# Altium footprint library passive.PcbLib: 73 footprints (part 5 of 5)
Each footprint in its own frame and in the unit in brackets; x right, y up, seen from the top. Pads: shape width x height; smd on the part's side, far side on the other; paste and mask are expansions set on the pad; w line width, h text height; cw(c..) or ccw(c..) is an arc to the next point about the centre after c.
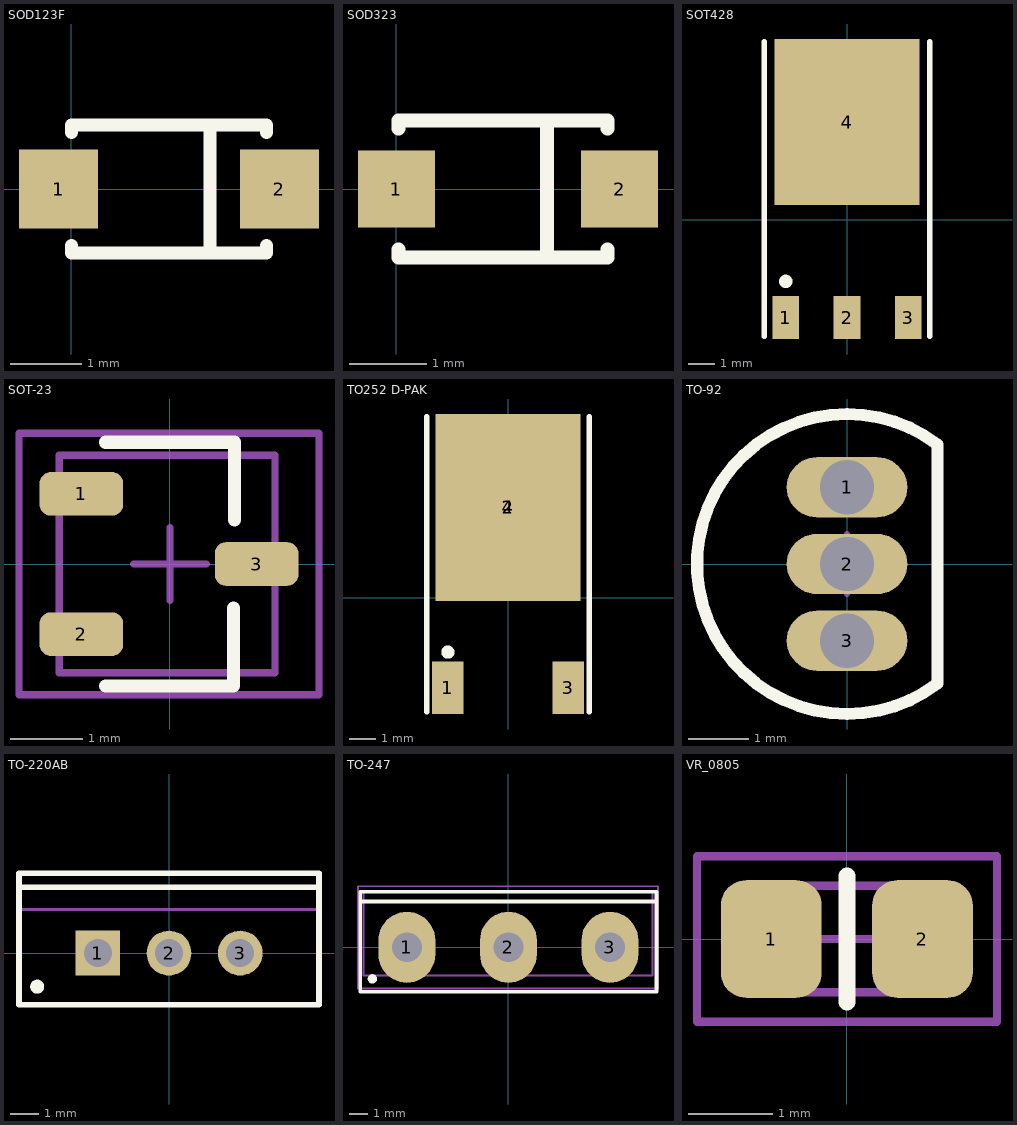
[diagram p4: the footprints below, top view; thin cyan lines are the x and y axes]

## SOD123F [mm]
pads (2):
  rect 1.1x1.1 smd: 1(-0.178,0) 2(2.896,0)
Top Overlay:
  lines w0.18: 0,-0.787 0,-0.889 2.718,-0.889 2.718,-0.787 ; 0,0.787 0,0.889 2.718,0.889 2.718,0.787 ; 1.93,-0.864 1.93,0.889
3D body "User Library-SOD3716X14.step": height 1.35, standoff 0, extent -0.491,-0.762 3.209,0.787

## SOD323 [mm]
height 1.1
pads (2):
  rect 1x1 smd: 1(0,0) 2(2.9,0)
Top Overlay:
  lines w0.18: 0.025,-0.787 0.025,-0.889 2.743,-0.889 2.743,-0.787 ; 0.025,0.787 0.025,0.889 2.743,0.889 2.743,0.787 ; 1.956,-0.864 1.956,0.889
3D body "User Library-SOD323-1.step": height 1.1, standoff 0, extent 0.148,-0.675 2.748,0.675

## SOT428 [mm] "D-PAK/TO-252-AA; 3 Leads (1 Cropped); Body 10.4 (inc. leads) x 6.7 mm (LxW max)"
height 2.38
pads (4):
  rect 1x1.6 smd: 1(-2.285,-3.65) 2(0,-3.65) 3(2.285,-3.65)
  rect 5.4x6.2 smd: 4(0,3.65)
Top Overlay:
  circle w0.25: c-2.285,-2.3 r0.125
  lines w0.2: -3.085,-4.35 -3.085,6.65 ; 3.085,-4.35 3.085,6.65

## SOT-23 [mm] "SOT23, 3-Leads, Body 2.9x1.3mm, Pitch 0.95mm, Lead Span 2.5mm, IPC Medium Density"
height 1.1
pads (3):
  rrect50% 1.15x0.6 smd: 1(-1.219,0.965) 2(-1.219,-0.965) 3(1.194,0)
Top Overlay:
  lines w0.18: -0.889,-1.678 0.878,-1.678 0.878,-0.61 ; -0.889,1.676 0.889,1.676 0.889,0.61
Mechanical 13:
  lines w0.1: -1.524,-1.499 1.448,-1.499 1.448,1.499 -1.524,1.499 -1.524,-1.499
  text ".Designator" at -1.681,1.782 h0.5
  text ".Value" at -1.016,-0.152 h0.5
Mechanical 15:
  lines w0.1: -0.5,0 0.5,0 ; 0,-0.5 0,0.5 ; -2.078,-1.799 2.053,-1.799 2.053,1.799 -2.078,1.799 -2.078,-1.799
3D body "User Library-SOT95P280X135-3M[SOT23_TO-236AA].step": height 1.3, standoff 0, extent -1.525,-1.5 1.475,1.5

## TO252 D-PAK [mm] "D-PAK/TO-252-AA; 3 Leads (1 Cropped); Body 10.4 (inc. leads) x 6.7 mm (LxW max)"
height 2.38
pads (4):
  rect 1.2x2 smd: 1(-2.285,-3.425) 3(2.285,-3.425)
  rect 5.5x7.1 smd: 2(0,3.425) 4(0,3.425)
Top Overlay:
  circle w0.25: c-2.285,-2.075 r0.125
  lines w0.2: -3.085,-4.35 -3.085,6.875 ; 3.085,-4.35 3.085,6.875

## TO-92 [mm] "TO, Flat Index; 3 In-Line, Axial Leads; Body Dia. 4.5mm; Leads 0.51 x 0.48 mm (max)"
height 6.86
pads (3):
  oval 2x1 hole 0.9: 1(0,1.27) 2(0,0) 3(0,-1.27)
Top Overlay:
  lines w0.2: 1.5,-1.98 cw(c0,0) 1.5,1.98 1.5,-1.98
Mechanical 13:
  lines w0.1: 1.5,-1.98 cw(c0,0) 1.5,1.98 1.5,-1.98
Mechanical 15:
  lines w0.1: -0.5,0 0.5,0 ; 0,-0.5 0,0.5
3D body "User Library-MPSA92 Transistors PNP TO-92 3L (2,54mm).step": height 4.82, standoff -14.7, extent -2.38,-2.38 1.25,2.38

## TO-220AB [mm] "TO, Thru-Hole, Vertical, Heatsink Mounted; 3 In-Line Leads; Pitch 2.54 mm"
height 19.3
pads (3):
  rect 1.6x1.6 hole 1: 1(-2.54,0)
  round 1.6 hole 1: 2(0,0) 3(2.54,0)
Top Overlay:
  circle w0.25: c-4.7,-1.2 r0.125
  lines w0.2: -5.35,2.35 5.35,2.35 ; -5.35,-1.85 5.35,-1.85 5.35,2.85 -5.35,2.85 -5.35,-1.85
Mechanical 13:
  lines w0.1: -5.35,1.55 5.35,1.55 ; -5.35,-1.85 -5.35,2.85 5.35,2.85 5.35,-1.85 -5.35,-1.85
Mechanical 15:
  lines w0.1: -0.5,0 0.5,0 ; 0,-0.5 0,0.5
3D body: height 19.3, standoff 12.9, extent -5.349,1.551 5.349,2.849
3D body: height 12.9, standoff 4, extent -5.4,-1.9 5.4,2.9

## TO-247 [mm] "SIP with Mounting Hole; 3 Leads; Body 20 x 15.6 x 5 mm (typ); Pitch 5.45 mm"
height 24.6
pads (3):
  oval 3.048x3.81 hole 1.6: 1(-5.45,0) 2(0,0) 3(5.45,0)
Top Overlay:
  circle w0.25: c-7.3,-1.696 r0.125
  lines w0.2: -7.95,2.454 7.95,2.454 ; -7.95,-2.388 7.95,-2.388 7.95,2.976 -7.95,2.976 -7.95,-2.388
Mechanical 13:
  lines w0.1: -7.772,-1.524 7.725,-1.524 7.725,2.976 -7.772,2.976 -7.772,-1.524
  text ".Designator" at -7.818,3.267 h0.5
  text ".Value" at -1.067,0.33 h0.5
Mechanical 15:
  lines w0.1: -0.5,0 0.5,0 ; 0,-0.5 0,0.5 ; -8.072,-2.205 8.026,-2.205 8.026,3.276 -8.072,3.276 -8.072,-2.205
3D body "User Library-TOP3.step": height 27.9, standoff -8, extent -7.775,-1.524 7.725,2.976

## VR_0805 [mm] "Chip Varistor Body 2.0x1.2mm, IPC Medium Density"
height 0.7
pads (2):
  rrect50% 1.2x1.4 smd: 1(-0.9,0) 2(0.9,0)
Top Overlay:
  lines w0.2: 0,-0.749 0,0.749
Mechanical 13:
  lines w0.1: -1.027,-0.635 1.005,-0.635 1.005,0.635 -1.027,0.635 -1.027,-0.635
  text ".Designator" at -1.666,0.943 h0.5
  text ".Value" at -0.914,-0.254 h0.5
Mechanical 15:
  lines w0.1: -0.5,0 0.5,0 ; 0,-0.5 0,0.5 ; -1.784,-0.986 1.788,-0.986 1.788,0.986 -1.784,0.986 -1.784,-0.986
3D body "User Library-ind_0805.step": height 0.95, standoff 0, extent -1.011,-0.625 0.989,0.575